# Altium schematic symbol library CUSTOM SCH - Copy.SchLib: 494 symbols (part 2 of 6) (continued)
## DMX_CON (continued)
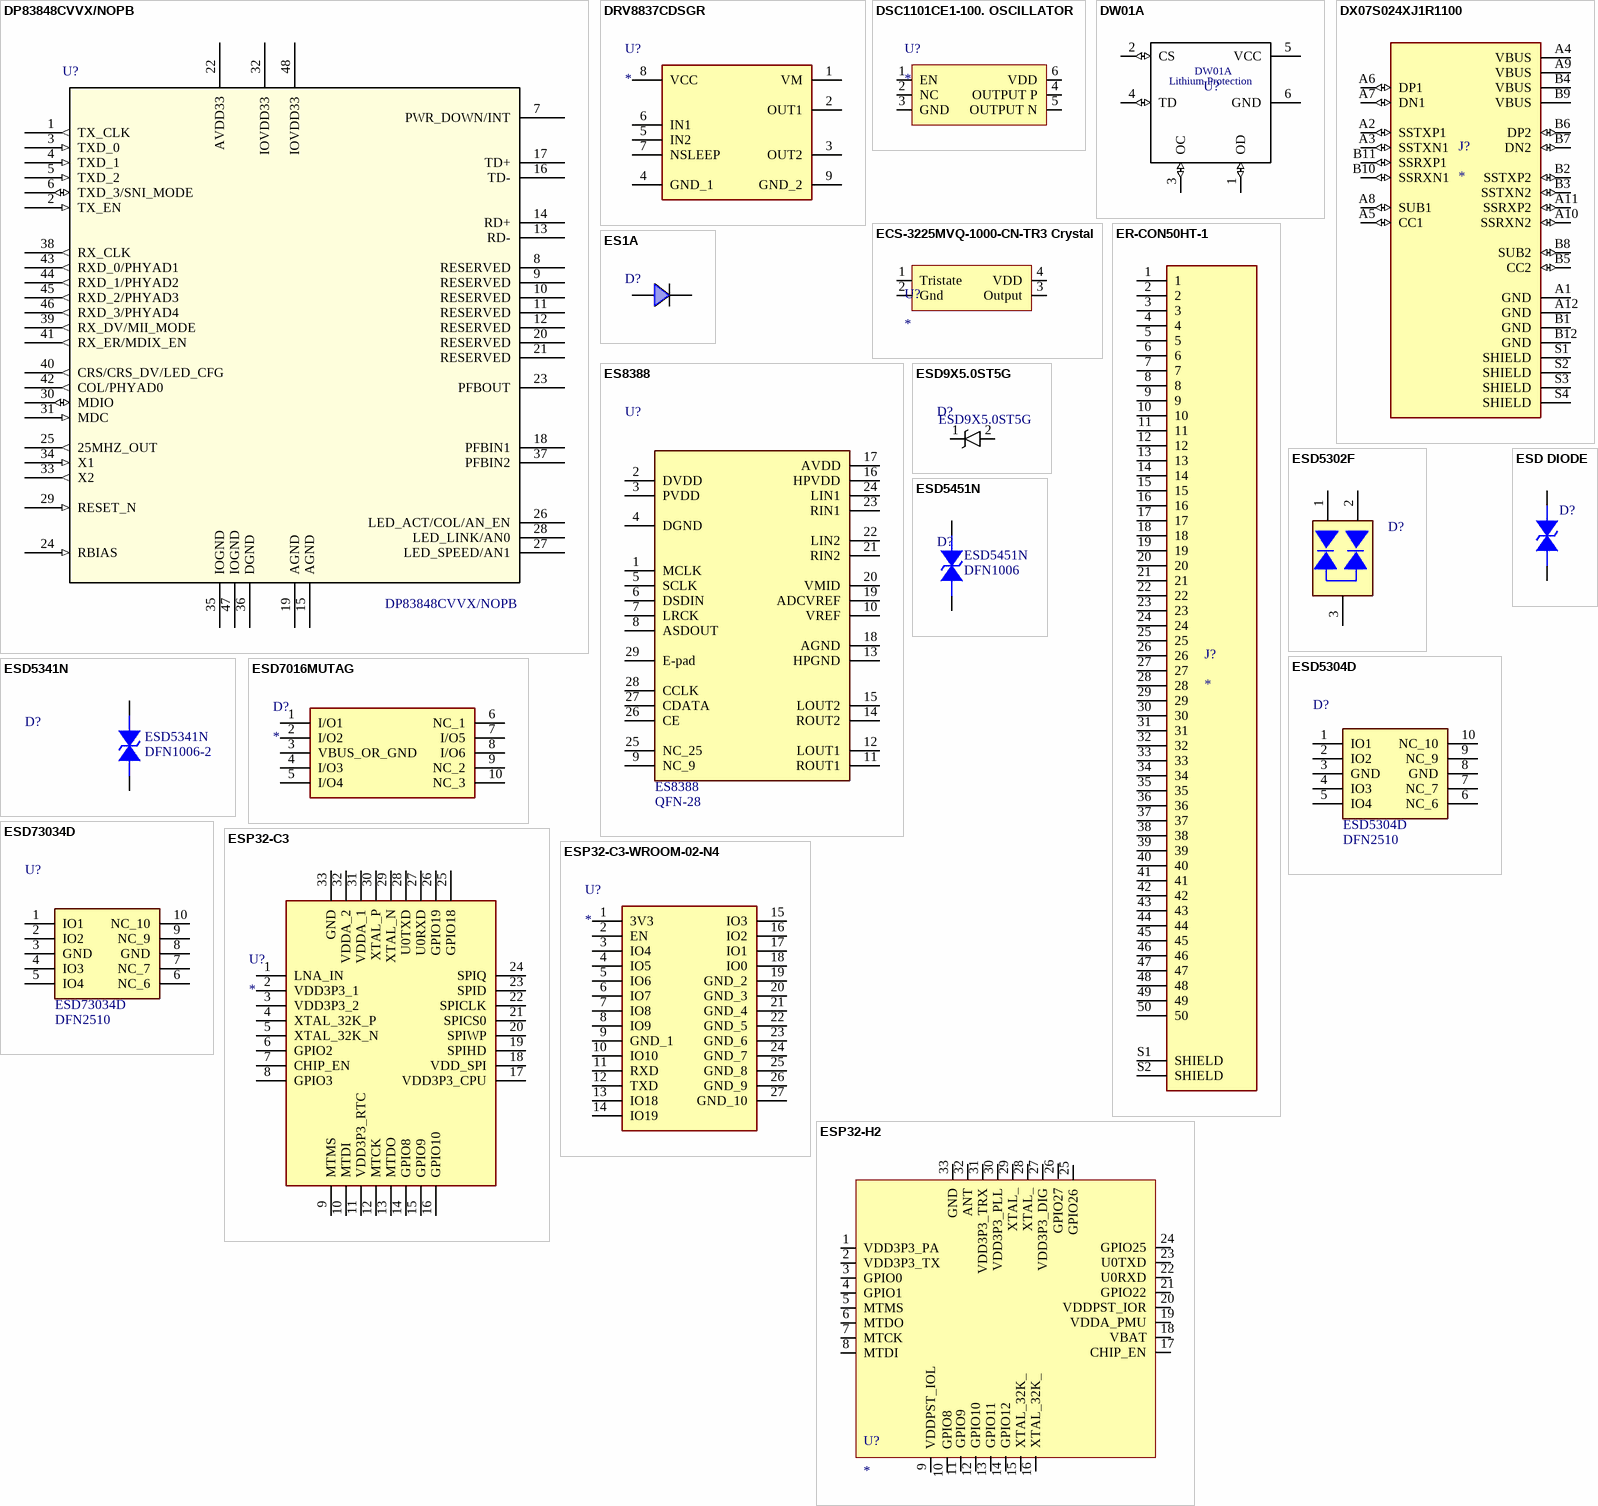
[diagram p9: symbols DP83848CVVX/NOPB to ESP32-H2]
text: O

## DP83848CVVX/NOPB
designator U?
IC TXRX ETHERNET 48LQFP; Manufacturer: TI National Semiconductor; Number of Channels: 1; Max Supply Voltage: 3.6V; Min Supply Voltage: 3V; Operating Supply Voltage: 3.3V; Nominal Supply Current: 92mA; Data Rate: 100Mbps; Max Power Dissipation: 267mW; Interface: Serial; Cable Length: 137m; Supplier 1: Digi-Key; Stock 1: 28934; Pricing 1: 1=5.16, 10=4.638, 100=3.8001, 500=3.2349 (USD); Mount: Surface Mount; Case/Package: 48-LQFP; Number of Pins: 48; Weight: 0.006409oz; Min Operating Temperature: 0°C; Max Operating Temperature: 70°C; Packaging: Tape and Reel; Package Quantity: 1000; Number of Transceivers: 1; Max Supply Current: 92mA; Length: 7mm; Height: 1.4mm; Width: 7mm; Radiation Hardening: No; REACH SVHC: No SVHC; Lead Free: Lead Free; ComponentLink1URL: http://www.ti.com/lit/ds/symlink/dp83848c.pdf?src-supplier=Digi-Key; ComponentLink1Description: http://www.ti.com/lit/ds/symlink/dp83848c.pdf?src-supplier=Digi-Key; ComponentLink2URL: http://www.ti.com/general/docs/lit/getliterature.tsp?genericPartNumber=DP83848YB&&fileType=pdf&src-supplier=Avnet; ComponentLink2Description: http://www.ti.com/general/docs/lit/getliterature.tsp?genericPartNumber=DP83848YB&&fileType=pdf&src-supplier=Avnet; ComponentLink3URL: http://www.ti.com/lit/gpn/dp83848c?src-supplier=Mouser; ComponentLink3Description: http://www.ti.com/lit/gpn/dp83848c?src-supplier=Mouser; ComponentLink4URL: http://www.farnell.com/datasheets/1668041.pdf?src-supplier=Element14; ComponentLink4Description: http://www.farnell.com/datasheets/1668041.pdf?src-supplier=Element14; Supplier Part Number 1: DP83848CVVX/NOPBCT-ND; Manufacturer Part Number: DP83848CVVX/NOPB
footprint 48LQFP
pins: 1 TX_CLK (out), 2 TX_EN (in), 3 TXD_0 (in), 4 TXD_1 (in), 5 TXD_2 (in), 6 TXD_3/SNI_MODE (io), 7 PWR_DOWN/INT, 8 RESERVED, 9 RESERVED, 10 RESERVED, 11 RESERVED, 12 RESERVED, 13 RD-, 14 RD+, 15 AGND (power), 16 TD-, 17 TD+, 18 PFBIN1, 19 AGND (power), 20 RESERVED, 21 RESERVED, 22 AVDD33 (power), 23 PFBOUT, 24 RBIAS (in), 25 25MHZ_OUT (out), 26 LED_ACT/COL/AN_EN, 27 LED_SPEED/AN1, 28 LED_LINK/AN0, 29 RESET_N (in), 30 MDIO (io), 31 MDC (in), 32 IOVDD33 (power), 33 X2 (out), 34 X1 (in), 35 IOGND (power), 36 DGND (power), 37 PFBIN2, 38 RX_CLK (out), 39 RX_DV/MII_MODE (out), 40 CRS/CRS_DV/LED_CFG (out), 41 RX_ER/MDIX_EN (out), 42 COL/PHYAD0 (out), 43 RXD_0/PHYAD1 (out), 44 RXD_1/PHYAD2 (out), 45 RXD_2/PHYAD3 (out), 46 RXD_3/PHYAD4 (out), 47 IOGND (power), 48 IOVDD33 (power)

## DRV8837CDSGR
designator U?
1A Low-Voltage H-Bridge Driver; Manufacturer_Part_Number: DRV8837CDSGR; Case/Package: WSON-8
footprint SON50P200X200X80-9N
pins: 1 VM, 2 OUT1, 3 OUT2, 4 GND_1, 5 IN2, 6 IN1, 7 NSLEEP, 8 VCC, 9 GND_2

## DSC1101CE1-100. OSCILLATOR
designator U?
2.25V~3.6V -20℃~+70℃ 35mA 24MHz SMD3225-6P Oscillators ROHS; Manufacturer Part Number: DSC1101CE1-100.0000; Case/Package: *
pins: 1 EN, 2 NC, 3 GND, 4 OUTPUT P, 5 OUTPUT N, 6 VDD

## DW01A
designator U?  (value not drawn)
DW01A battery protection IC SOT-23-6; Case/Package: SOT-23-6; Manufacturer Part Number: DW01A
footprint SOT-23-6
pins: 1 OD (io), 2 CS (io), 3 OC (io), 4 TD (io), 5 VCC (power), 6 GND (power)
text: Lithium Protection

## DX07S024XJ1R1100
designator J?
USB-C _USB TYPE-C_ USB 3.1 _USB 3.1 Gen 2, Superspeed+_ Receptacle Connector 24 Position Surface Mount, Right Angle; Through Hole; Manufacturer Part Number: DX07S024XJ1R1100; Case/Package: None
footprint JAE_DX07S024XJ1R1100
footprint USB Type C 24 Pin
pins: A1 GND (power), A2 SSTXP1 (io), A3 SSTXN1 (io), A4 VBUS (power), A5 CC1 (io), A6 DP1 (io), A7 DN1 (io), A8 SUB1 (io), A9 VBUS (power), A10 SSRXN2 (io), A11 SSRXP2 (io), A12 GND (power), B1 GND (power), B2 SSTXP2 (io), B3 SSTXN2 (io), B4 VBUS (power), B5 CC2 (io), B6 DP2 (io), B7 DN2 (io), B8 SUB2 (io), B9 VBUS (power), B10 SSRXN1 (io), B11 SSRXP1 (io), B12 GND (power), S1 SHIELD, S2 SHIELD, S3 SHIELD, S4 SHIELD

## ECS-3225MVQ-1000-CN-TR3 Crystal
designator U?
footprint ECS-3225MVQ-1000-CN-TR3
pins: 1 Tristate, 2 Gnd, 3 Output, 4 VDD

## ER-CON50HT-1
designator J?
50 pins 0.5 Pitch SMD Horizontal Type Top Contact; Manufacturer Part Number: ER-CON50HT-1; Value: *; Package: Package Analog Devices
footprint EASTRISING_ER-CON50HT-1
footprint EASTRISING ER-CON50HT-1
pins: 1, 2, 3, 4, 5, 6, 7, 8, 9, 10, 11, 12, 13, 14, 15, 16, 17, 18, 19, 20, 21, 22, 23, 24, 25, 26, 27, 28, 29, 30, 31, 32, 33, 34, 35, 36, 37, 38, 39, 40, 41, 42, 43, 44, 45, 46, 47, 48, 49, 50, S1 SHIELD, S2 SHIELD

## ES1A
designator D?
DIODE GEN PURP 50V 1A SMA; Manufacturer: ON Semiconductor / Fairchild; Manufacturer Part Number: ES1A; Forward Voltage: 920mV; Peak Reverse Current: 5uA; Reverse Recovery Time: 15ns; Element Configuration: Single; Polarity: Standard; Capacitance: 7pF; Max Surge Current: 30A; Power Dissipation: 1.47W; Supplier 1: Digi-Key; Stock 1: 45000; Pricing 1: 7500=0.0787, 15000=0.0699, 37500=0.0656, 52500=0.0612 (USD); Mount: Surface Mount; Case/Package: SMA; Number of Pins: 2; Weight: 0.106g; Contact Plating: Tin,Matte; Min Operating Temperature: -50°C; Max Operating Temperature: 150°C; Packaging: Tape and Reel; Package Quantity: 7500; Max Repetitive Reverse Voltage (Vrrm): 50V; Forward Current: 1A; Voltage Rating (DC): 50V; Current Rating: 1A; Output Current: 1A; Recovery Time: 15ns; Average Rectified Current: 1A; Peak Non-Repetitive Surge Current: 30A; Max Forward Surge Current (Ifsm): 30A; Termination: SMD/SMT; Reverse Voltage: 50V; Max Reverse Voltage (DC): 50V; Length: 4.6mm; Height: 2.235mm; Width: 2.896mm; Radiation Hardening: No; REACH SVHC: No SVHC; Lead Free: Lead Free; ComponentLink1URL: http://www.mouser.com/ds/2/149/ES1A-183553.pdf?src-supplier=Mouser; ComponentLink1Description: http://www.mouser.com/ds/2/149/ES1A-183553.pdf?src-supplier=Mouser; ComponentLink2URL: http://www.farnell.com/datasheets/575529.pdf?src-supplier=Element14; ComponentLink2Description: http://www.farnell.com/datasheets/575529.pdf?src-supplier=Element14; ComponentLink3URL: http://www.fairchildsemi.com/ds/ES/ES1D.pdf?src-supplier=Avnet+Europe; ComponentLink3Description: http://www.fairchildsemi.com/ds/ES/ES1D.pdf?src-supplier=Avnet+Europe; ComponentLink4URL: http://www.fairchildsemi.com/datasheets/ES/ES1A.pdf?src-supplier=Digi-Key; ComponentLink4Description: http://www.fairchildsemi.com/datasheets/ES/ES1A.pdf?src-supplier=Digi-Key; ComponentLink5URL: https://www.fairchildsemi.com/package-drawings/DO/DO214AC.pdf?src-supplier=Digi-Key; ComponentLink5Description: https://www.fairchildsemi.com/package-drawings/DO/DO214AC.pdf?src-supplier=Digi-Key; Supplier Part Number 1: ES1AFSTR-ND
footprint es1a
pins: 1, 2

## ES8388
designator U?  Manufacturer Part Number: ES8388  Case/Package: QFN-28
ES8388 Audio Codec
footprint QFN28_4X4
pins: 1 MCLK, 2 DVDD, 3 PVDD, 4 DGND, 5 SCLK, 6 DSDIN, 7 LRCK, 8 ASDOUT, 9 NC_9, 10 VREF, 11 ROUT1, 12 LOUT1, 13 HPGND (power), 14 ROUT2, 15 LOUT2, 16 HPVDD, 17 AVDD, 18 AGND (power), 19 ADCVREF, 20 VMID, 21 RIN2, 22 LIN2, 23 RIN1, 24 LIN1, 25 NC_25, 26 CE, 27 CDATA, 28 CCLK, 29 E-pad

## ESD9X5.0ST5G
designator D?  Manufacturer Part Number: ESD9X5.0ST5G
12.3V Clamp 8.7A (8/20µs) Ipp Tvs Diode Surface Mount SOD-923; Manufacturer: ON Semiconductor; Direction: Unidirectional; Number of Elements: 1; Capacitance: 65pF; Operating Supply Voltage: 5V; Reverse Breakdown Voltage: 6.2V; Peak Pulse Power: 107W; Power Line Protection: No; ESD Protection: Yes; Test Current: 1mA; Max Reverse Leakage Current: 1uA; Max Power Dissipation: 150mW; Element Configuration: Single; Supplier 1: Digi-Key; RoHS: Yes; Category: ESD and Circuit Protection ICs; Stock 1: 835133; Pricing 1: 1=0.14000, 10=0.12700, 25=0.12120, 100=0.05340, 250=0.05120, 500=0.04190, 1000=0.02910, 2500=0.02542 (USD); Case/Package: SOD-923-2; Number of Pins: 2; Contact Plating: Tin,Matte; Min Operating Temperature: -55°C; Max Operating Temperature: 150°C; Packaging: Tape and Reel; Package Quantity: 1; Max Surge Current: 8.7A; Number of Unidirectional Channels: 1; Reverse Standoff Voltage: 5V; Min Breakdown Voltage: 6.2V; Clamping Voltage: 12.3V; Breakdown Voltage: 6.2V; Number of Channels: 1; Polarity: Unidirectional; Termination: SMD/SMT; Working Voltage: 5V; Leakage Current: 1uA; Max Breakdown Voltage: 6.2V; Peak Pulse Current: 8.7A; Number of Lines: 1; Composition: Zener; Length: 0.8mm; Height: 0.4mm; Width: 0.65mm; Depth: 0.6mm; Radiation Hardening: No; Lead Free: Lead Free; REACH SVHC: No SVHC; Halogen Free: Halogen Free; ComponentLink1URL: https://datasheet.ciiva.com/30478/0900766b812769b5-30478676.pdf?src-supplier=RSComponents; ComponentLink1Description: https://datasheet.ciiva.com/30478/0900766b812769b5-30478676.pdf?src-supplier=RSComponents; ComponentLink2URL: https://datasheet.ciiva.com/25958/esd9x3-3st5g-d-25958458.pdf?src-supplier=Avnet+Europe; ComponentLink2Description: https://datasheet.ciiva.com/25958/esd9x3-3st5g-d-25958458.pdf?src-supplier=Avnet+Europe; ComponentLink3URL: https://datasheet.ciiva.com/1219/1748783-1219324.pdf?src-supplier=Newark; ComponentLink3Description: https://datasheet.ciiva.com/1219/1748783-1219324.pdf?src-supplier=Newark; ComponentLink4URL: https://datasheet.ciiva.com/3304/esd9x3-3st5g-d-3304012.pdf?src-supplier=Avnet; ComponentLink4Description: https://datasheet.ciiva.com/3304/esd9x3-3st5g-d-3304012.pdf?src-supplier=Avnet; ComponentLink5URL: https://datasheet.ciiva.com/339/esd9x3-3st5g-d-339709.pdf?src-supplier=Digi-Key; ComponentLink5Description: https://datasheet.ciiva.com/339/esd9x3-3st5g-d-339709.pdf?src-supplier=Digi-Key; ComponentLink6URL: https://datasheet.ciiva.com/16215/esd9x3-3st5g-d-16215149.pdf?src-supplier=Future+Electronics; ComponentLink6Description: https://datasheet.ciiva.com/16215/esd9x3-3st5g-d-16215149.pdf?src-supplier=Future+Electronics; ComponentLink7URL: https://datasheet.ciiva.com/339/esd9x3-3st5g-d-339710.pdf?src-supplier=Digi-Key; ComponentLink7Description: https://datasheet.ciiva.com/339/esd9x3-3st5g-d-339710.pdf?src-supplier=Digi-Key; ComponentLink8URL: https://datasheet.ciiva.com/339/esd9x3-3st5g-d-339711.pdf?src-supplier=Digi-Key; ComponentLink8Description: https://datasheet.ciiva.com/339/esd9x3-3st5g-d-339711.pdf?src-supplier=Digi-Key; Supplier Part Number 1: ESD9X5.0ST5GOSCT-ND
footprint SOD-923
pins: 1 K, 2 A

## ESD5302F
designator D?
2-Lines, Uni-directional,Ultra-low Capacitance.Transient Voltage Suppressors; Manufacturer Part Number: ESD5302F; Case/Package: SOT-23-3
footprint SOT_23
footprint SOT23-3
pins: 1, 2, 3

## ESD5304D
designator D?  Manufacturer Part Number: ESD5304D  Case/Package: DFN2510
4-Lines, Uni-directional, Ultra-low Capacitance Transient Voltage Suppressors
footprint SON10_2R50X1R00X0R50
footprint DFN2510-10
pins: 1 IO1, 2 IO2, 3 GND (power), 4 IO3, 5 IO4, 6 NC_6, 7 NC_7, 8 GND (power), 9 NC_9, 10 NC_10

## ESD5341N
designator D?  Case/Package: DFN1006-2  Manufacturer Part Number: ESD5341N
1-Line, Bi-directional, Transient Voltage Suppressors.1pF.
footprint ESD0402
footprint DFN1006-2L
pins: 1, 2

## ESD5451N
designator D?  Manufacturer Part Number: ESD5451N  Case/Package: DFN1006
1-Line, Bi-directional, Transient Voltage Suppressors.17.5pF.
footprint ESD0402
footprint DFN1006-2L
pins: 1, 2

## ESD7016MUTAG
designator D?
ON Semiconductor ESD7016MUTAG Uni-Directional TVS Diode Array; Manufacturer Part Number: ESD7016MUTAG; Case/Package: 10-UFDFN
footprint ESD8006MUTAG
pins: 1 I/O1, 2 I/O2, 3 VBUS_OR_GND, 4 I/O3, 5 I/O4, 6 NC_1, 7 I/O5, 8 I/O6, 9 NC_2, 10 NC_3

## ESD73034D
designator U?  Manufacturer Part Number: ESD73034D  Case/Package: DFN2510
4-Lines, Uni-directional, Ultra-low Capacitance Transient Voltage Suppressors
footprint SON10_2R50X1R00X0R50
footprint DFN2510-10
pins: 1 IO1, 2 IO2, 3 GND (power), 4 IO3, 5 IO4, 6 NC_6, 7 NC_7, 8 GND (power), 9 NC_9, 10 NC_10

## ESD DIODE
designator D?
Bidirectional
pins: 1, 2

## ESP32-C3
designator U?
Ultra-Low-Power SoC with RISC-V Single-Core CPU; Manufacturer Part Number: ESP32-C3; Case/Package: QFN-32
footprint esp32_c3
pins: 1 LNA_IN, 2 VDD3P3_1, 3 VDD3P3_2, 4 XTAL_32K_P, 5 XTAL_32K_N, 6 GPIO2, 7 CHIP_EN, 8 GPIO3, 9 MTMS, 10 MTDI, 11 VDD3P3_RTC, 12 MTCK, 13 MTDO, 14 GPIO8, 15 GPIO9, 16 GPIO10, 17 VDD3P3_CPU, 18 VDD_SPI, 19 SPIHD, 20 SPIWP, 21 SPICS0, 22 SPICLK, 23 SPID, 24 SPIQ, 25 GPIO18, 26 GPIO19, 27 U0RXD, 28 U0TXD, 29 XTAL_N, 30 XTAL_P, 31 VDDA_1, 32 VDDA_2, 33 GND

## ESP32-C3-WROOM-02-N4
designator U?
WiFi Modules (802.11) SMD module; Manufacturer Part Number: ESP32-C3-WROOM-02-N4; Case/Package: SMD
footprint ESP32 C3 WROOM (ESP32-C3-WROOM-02-H4)
pins: 1 3V3, 2 EN, 3 IO4, 4 IO5, 5 IO6, 6 IO7, 7 IO8, 8 IO9, 9 GND_1, 10 IO10, 11 RXD, 12 TXD, 13 IO18, 14 IO19, 15 IO3, 16 IO2, 17 IO1, 18 IO0, 19 GND_2, 20 GND_3, 21 GND_4, 22 GND_5, 23 GND_6, 24 GND_7, 25 GND_8, 26 GND_9, 27 GND_10

## ESP32-H2
designator U?
footprint ESP32_h2
pins: 1 VDD3P3_PA, 2 VDD3P3_TX, 3 GPIO0, 4 GPIO1, 5 MTMS, 6 MTDO, 7 MTCK, 8 MTDI, 9 VDDPST_IOL, 10 GPIO8, 11 GPIO9, 12 GPIO10, 13 GPIO11, 14 GPIO12, 15 XTAL_32K_, 16 XTAL_32K_, 17 CHIP_EN, 18 VBAT, 19 VDDA_PMU, 20 VDDPST_IOR, 21 GPIO22, 22 U0RXD, 23 U0TXD, 24 GPIO25, 25 GPIO26, 26 GPIO27, 27 VDD3P3_DIG, 28 XTAL_, 29 XTAL_, 30 VDD3P3_PLL, 31 VDD3P3_TRX, 32 ANT, 33 GND

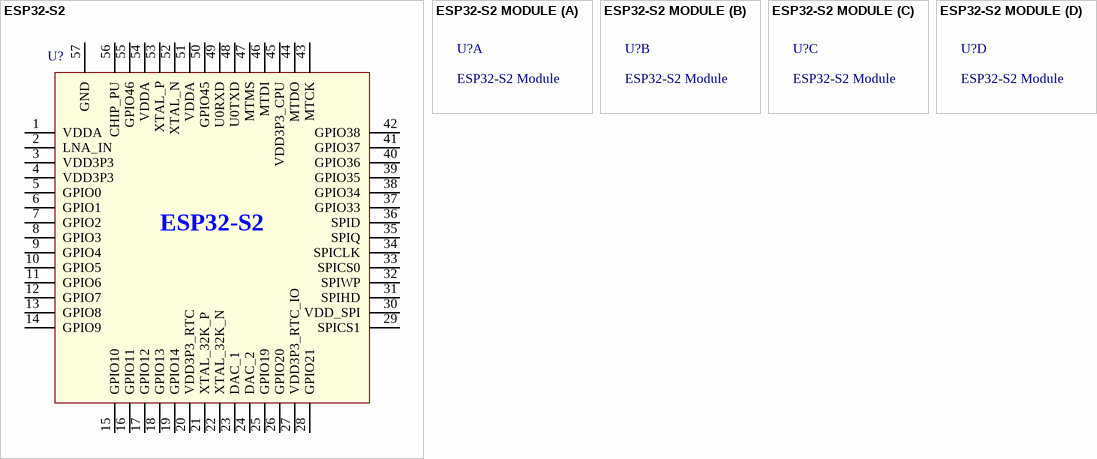
[diagram p10: symbols ESP32-S2 to ESP32-S2 MODULE]

## ESP32-S2
designator U?  (value not drawn)
WiFi 802.11b/g/n Transceiver Module 2.4GHz; Case/Package: 56-VFQFN; Manufacturer Part Number: ESP32-S2; Value: *
footprint QFN56-7x7mm
pins: 1 VDDA, 2 LNA_IN, 3 VDD3P3, 4 VDD3P3, 5 GPIO0, 6 GPIO1, 7 GPIO2, 8 GPIO3, 9 GPIO4, 10 GPIO5, 11 GPIO6, 12 GPIO7, 13 GPIO8, 14 GPIO9, 15 GPIO10, 16 GPIO11, 17 GPIO12, 18 GPIO13, 19 GPIO14, 20 VDD3P3_RTC, 21 XTAL_32K_P, 22 XTAL_32K_N, 23 DAC_1, 24 DAC_2, 25 GPIO19, 26 GPIO20, 27 VDD3P3_RTC_IO, 28 GPIO21, 29 SPICS1, 30 VDD_SPI, 31 SPIHD, 32 SPIWP, 33 SPICS0, 34 SPICLK, 35 SPIQ, 36 SPID, 37 GPIO33, 38 GPIO34, 39 GPIO35, 40 GPIO36, 41 GPIO37, 42 GPIO38, 43 MTCK, 44 MTDO, 45 VDD3P3_CPU, 46 MTDI, 47 MTMS, 48 U0TXD, 49 U0RXD, 50 GPIO45, 51 VDDA, 52 XTAL_N, 53 XTAL_P, 54 VDDA, 55 GPIO46, 56 CHIP_PU, 57 GND

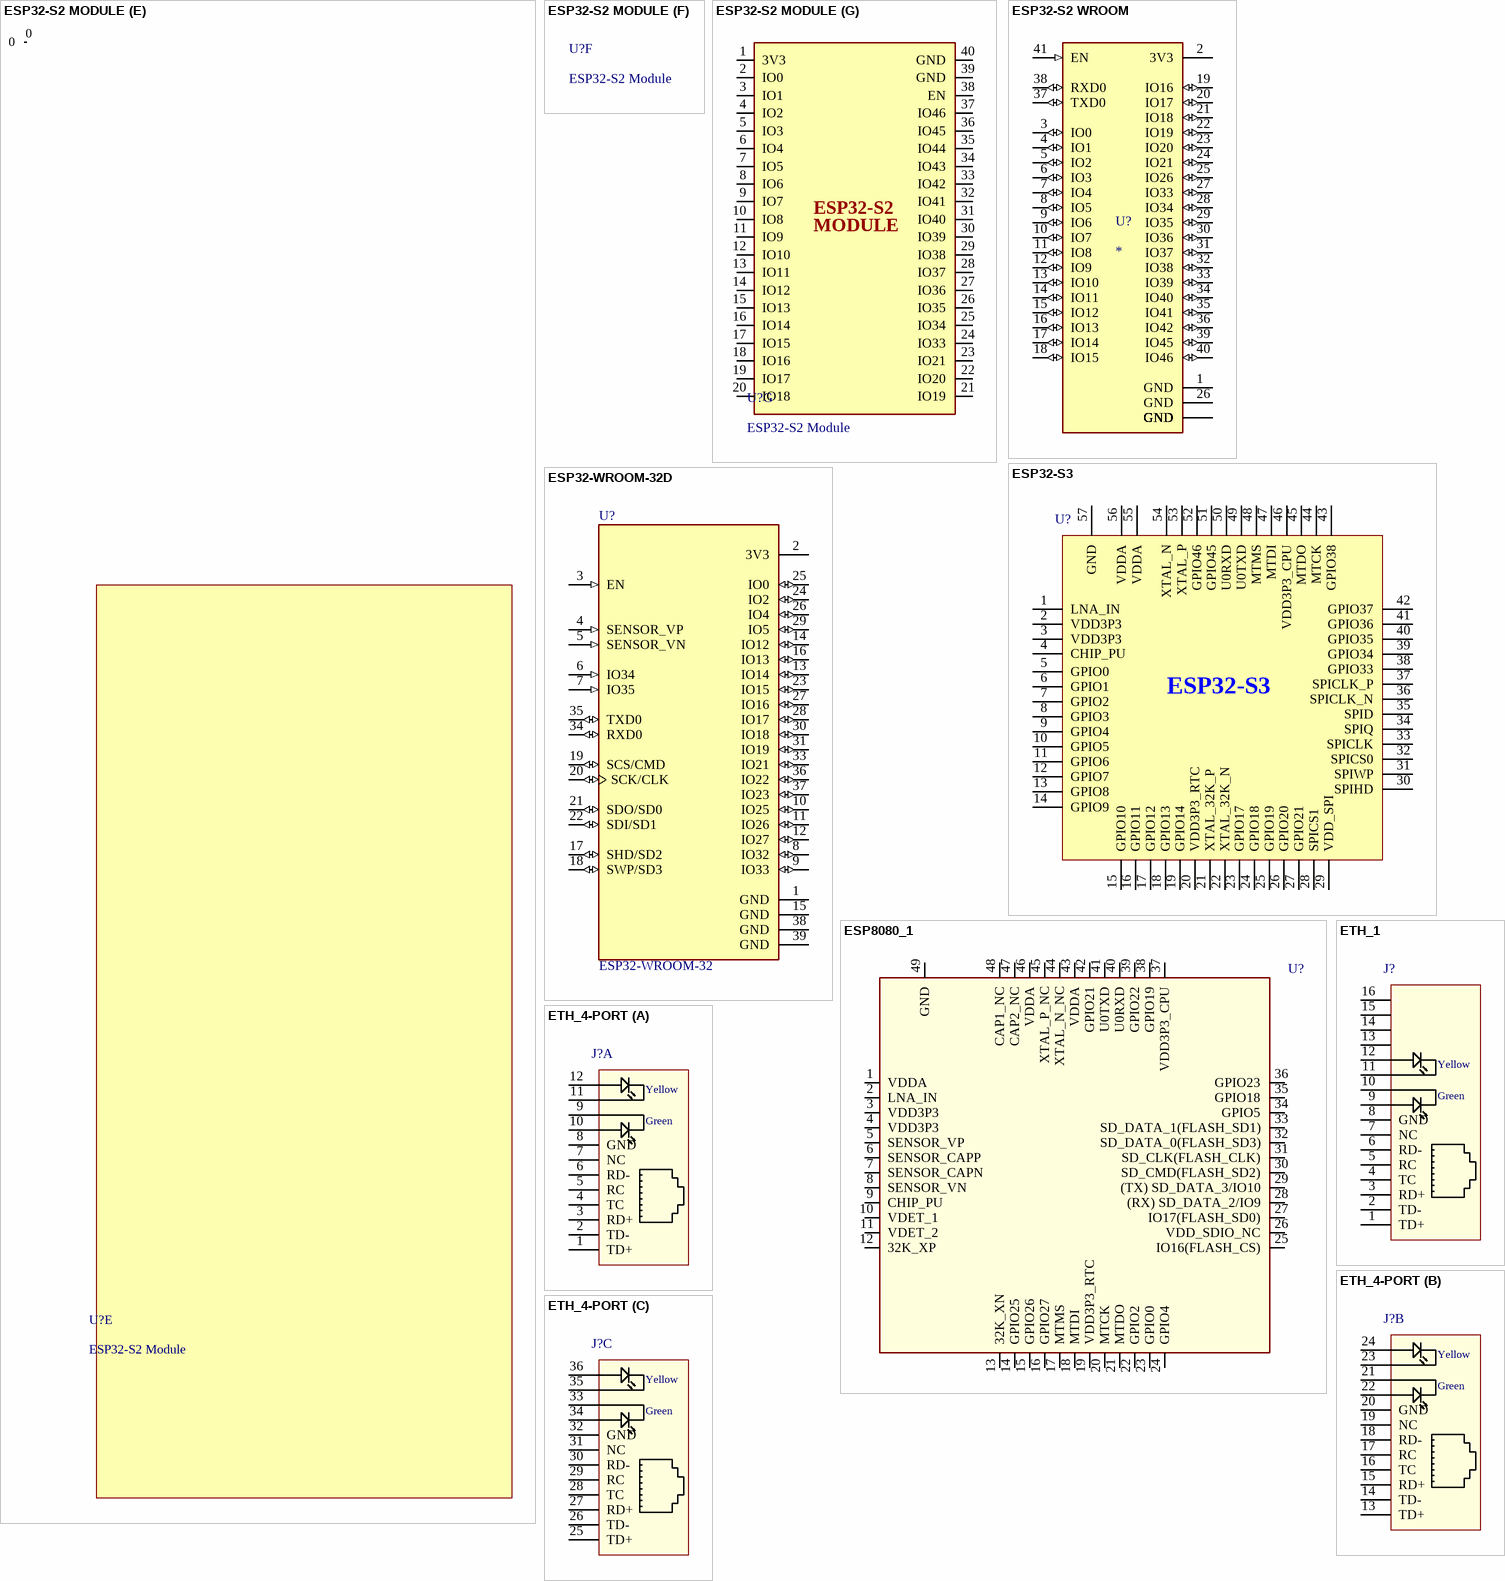
[diagram p11: symbols ESP32-S2 MODULE to ETH_4-PORT]

## ESP32-S2 MODULE
designator U?, comment ESP32-S2 Module
ESP32-S2 Module PCB mount 20*40 mm; Case/Package: SMD; Manufacturer Part Number: *
footprint ESP32-S2 Module (ESP32-S2 Module 20*40mm)
part E pins: 0
part G pins: 1 3V3, 2 IO0, 3 IO1, 4 IO2, 5 IO3, 6 IO4, 7 IO5, 8 IO6, 9 IO7, 10 IO8, 11 IO9, 12 IO10, 13 IO11, 14 IO12, 15 IO13, 16 IO14, 17 IO15, 18 IO16, 19 IO17, 20 IO18, 21 IO19, 22 IO20, 23 IO21, 24 IO33, 25 IO34, 26 IO35, 27 IO36, 28 IO37, 29 IO38, 30 IO39, 31 IO40, 32 IO41, 33 IO42, 34 IO43, 35 IO44, 36 IO45, 37 IO46, 38 EN, 39 GND, 40 GND
part G text: ESP32-S2; MODULE

## ESP32-S2 WROOM
designator U?
WiFi 802.11b/g/n Transceiver Module 2.4GHz PCB Trace Surface Mount; Manufacturer Part Number: ESP32-S2-WROOM; Case/Package: Castalled Module
footprint ESP32-S2 WROOM
pins: 1 GND (power), 2 3V3 (power), 3 IO0 (io), 4 IO1 (io), 5 IO2 (io), 6 IO3 (io), 7 IO4 (io), 8 IO5 (io), 9 IO6 (io), 10 IO7 (io), 11 IO8 (io), 12 IO9 (io), 13 IO10 (io), 14 IO11 (io), 15 IO12 (io), 16 IO13 (io), 17 IO14 (io), 18 IO15 (io), 19 IO16 (io), 20 IO17 (io), 21 IO18 (io), 22 IO19 (io), 23 IO20 (io), 24 IO21 (io), 25 IO26 (io), 26 GND (power), 27 IO33 (io), 28 IO34 (io), 29 IO35 (io), 30 IO36 (io), 31 IO37 (io), 32 IO38 (io), 33 IO39 (io), 34 IO40 (io), 35 IO41 (io), 36 IO42 (io), 37 TXD0 (io), 38 RXD0 (io), 39 IO45 (io), 40 IO46 (io), 41 EN (in), 42 GND (power), 43.1 GND (power), 43.2 GND (power), 43.3 GND (power), 43.4 GND (power), 43.5 GND (power), 43.6 GND (power), 43.7 GND (power), 43.8 GND (power), 43.9 GND (power), 43.10 GND (power), 43.11 GND (power), 43.12 GND (power), 43.13 GND (power), 43.14 GND (power), 43.15 GND (power), 43.16 GND (power), 43.17 GND (power), 43.18 GND (power), 43.19 GND (power), 43.20 GND (power), 43.21 GND (power)

## ESP32-S3
designator U?
ESP32-S3 SoC; Manufacturer Part Number: ESP32-S3; Case/Package: 56-VFQFN; Value: *
footprint ESP32-S3 (SoC)
pins: 1 LNA_IN, 2 VDD3P3, 3 VDD3P3, 4 CHIP_PU, 5 GPIO0, 6 GPIO1, 7 GPIO2, 8 GPIO3, 9 GPIO4, 10 GPIO5, 11 GPIO6, 12 GPIO7, 13 GPIO8, 14 GPIO9, 15 GPIO10, 16 GPIO11, 17 GPIO12, 18 GPIO13, 19 GPIO14, 20 VDD3P3_RTC, 21 XTAL_32K_P, 22 XTAL_32K_N, 23 GPIO17, 24 GPIO18, 25 GPIO19, 26 GPIO20, 27 GPIO21, 28 SPICS1, 29 VDD_SPI, 30 SPIHD, 31 SPIWP, 32 SPICS0, 33 SPICLK, 34 SPIQ, 35 SPID, 36 SPICLK_N, 37 SPICLK_P, 38 GPIO33, 39 GPIO34, 40 GPIO35, 41 GPIO36, 42 GPIO37, 43 GPIO38, 44 MTCK, 45 MTDO, 46 VDD3P3_CPU, 47 MTDI, 48 MTMS, 49 U0TXD, 50 U0RXD, 51 GPIO45, 52 GPIO46, 53 XTAL_P, 54 XTAL_N, 55 VDDA, 56 VDDA, 57 GND

## ESP32-WROOM-32D
designator U?  Manufacturer Part Number: ESP32-WROOM-32  (hidden comment: ESP32-WROOM-32D)
SMD MODULE, ESP32-D0WDQ6, 32MBIT; Manufacturer 1: Espressif Systems; Frequency: 2.5GHz; Data Rate: 150Mbps; Sensitivity: -98dBm; Operating Supply Voltage: 3.6V; Supplier 1: Digi-Key; RoHS: No; Category: RF Receivers, Transceivers; Pricing 1: 1=3.80000 (USD); Mount: Surface Mount; Case/Package: SMD/SMT; Weight: 0.088185oz; Min Operating Temperature: -40°C; Max Operating Temperature: 85°C; Packaging: Cut Tape; Package Quantity: 550; ComponentLink1URL: https://datasheet.ciiva.com/70828/esp32-wroom-32-datasheet-en-70828769.pdf?src-supplier=Digi-Key; ComponentLink1Description: https://datasheet.ciiva.com/70828/esp32-wroom-32-datasheet-en-70828769.pdf?src-supplier=Digi-Key; ComponentLink2URL: https://datasheet.ciiva.com/69725/esp32-datasheet-en-69725253.pdf?src-supplier=Digi-Key; ComponentLink2Description: https://datasheet.ciiva.com/69725/esp32-datasheet-en-69725253.pdf?src-supplier=Digi-Key; Supplier Part Number 1: 1904-1010-1-ND
footprint ESP32-WROOM-3D
pins: 1 GND (power), 2 3V3 (power), 3 EN (in), 4 SENSOR_VP (in), 5 SENSOR_VN (in), 6 IO34 (in), 7 IO35 (in), 8 IO32 (io), 9 IO33 (io), 10 IO25 (io), 11 IO26 (io), 12 IO27 (io), 13 IO14 (io), 14 IO12 (io), 15 GND (power), 16 IO13 (io), 17 SHD/SD2 (io), 18 SWP/SD3 (io), 19 SCS/CMD (io), 20 SCK/CLK (io), 21 SDO/SD0 (io), 22 SDI/SD1 (io), 23 IO15 (io), 24 IO2 (io), 25 IO0 (io), 26 IO4 (io), 27 IO16 (io), 28 IO17 (io), 29 IO5 (io), 30 IO18 (io), 31 IO19 (io), 33 IO21 (io), 34 RXD0 (io), 35 TXD0 (io), 36 IO22 (io), 37 IO23 (io), 38 GND (power), 39 GND (power)

## ESP8080_1
designator U?
ESP32 Wifi Bluetooth,4MByte Flash; Manufacturer 1: Espressif Systems; Manufacturer Part Number: ESP32-PICO-D4; Interface: I2C,SPI,GPIO,PWM,SDIO,UART; Frequency: 2.5GHz; Data Rate: 150Mbps; Sensitivity: -98.4dBm; Memory Size: 4MB; ComponentLink1URL: https://www.espressif.com/sites/default/files/documentation/esp32-pico-d4_datasheet_en.pdf?src-supplier=Digi-Key; ComponentLink1Description: https://www.espressif.com/sites/default/files/documentation/esp32-pico-d4_datasheet_en.pdf?src-supplier=Digi-Key; Supplier 1: Digi-Key; RoHS: No; Stock 1: 1598; Pricing 1: 1=4.50000 (USD); Mount: Surface Mount; Case/Package: QFN-48; Min Operating Temperature: -40°C; Max Operating Temperature: 85°C; Supplier Part Number 1: 1904-1029-1-ND
footprint ESP32_PICO_D4_2
pins: 1 VDDA, 2 LNA_IN, 3 VDD3P3, 4 VDD3P3, 5 SENSOR_VP, 6 SENSOR_CAPP, 7 SENSOR_CAPN, 8 SENSOR_VN, 9 CHIP_PU, 10 VDET_1, 11 VDET_2, 12 32K_XP, 13 32K_XN, 14 GPIO25, 15 GPIO26, 16 GPIO27, 17 MTMS, 18 MTDI, 19 VDD3P3_RTC, 20 MTCK, 21 MTDO, 22 GPIO2, 23 GPIO0, 24 GPIO4, 25 IO16(FLASH_CS), 26 VDD_SDIO_NC, 27 IO17(FLASH_SD0), 28 (RX) SD_DATA_2/IO9, 29 (TX) SD_DATA_3/IO10, 30 SD_CMD(FLASH_SD2), 31 SD_CLK(FLASH_CLK), 32 SD_DATA_0(FLASH_SD3), 33 SD_DATA_1(FLASH_SD1), 34 GPIO5, 35 GPIO18, 36 GPIO23, 37 VDD3P3_CPU, 38 GPIO19, 39 GPIO22, 40 U0RXD (power), 41 U0TXD (power), 42 GPIO21, 43 VDDA, 44 XTAL_N_NC, 45 XTAL_P_NC, 46 VDDA, 47 CAP2_NC, 48 CAP1_NC, 49 GND (power)

## ETH_1
designator J?
HR911105A - Hanrun - RJ45 Horizontal - Ethernet Transformer Sunrom Product Code for Ordering:4266; Case/Package: TH; Manufacturer Part Number: HR911105A
footprint ETH_2
pins: 1 TD+, 2 TD-, 3 RD+, 4 TC, 5 RC, 6 RD-, 7 NC, 8 GND, 9 G-ANODE, 10 G-CATHODE, 11 Y-CATHODE, 12 Y-ANODE, 13 SHELL4, 14 SHELL3, 15 SHELL2, 16 SHELL1
text: Yellow; Green

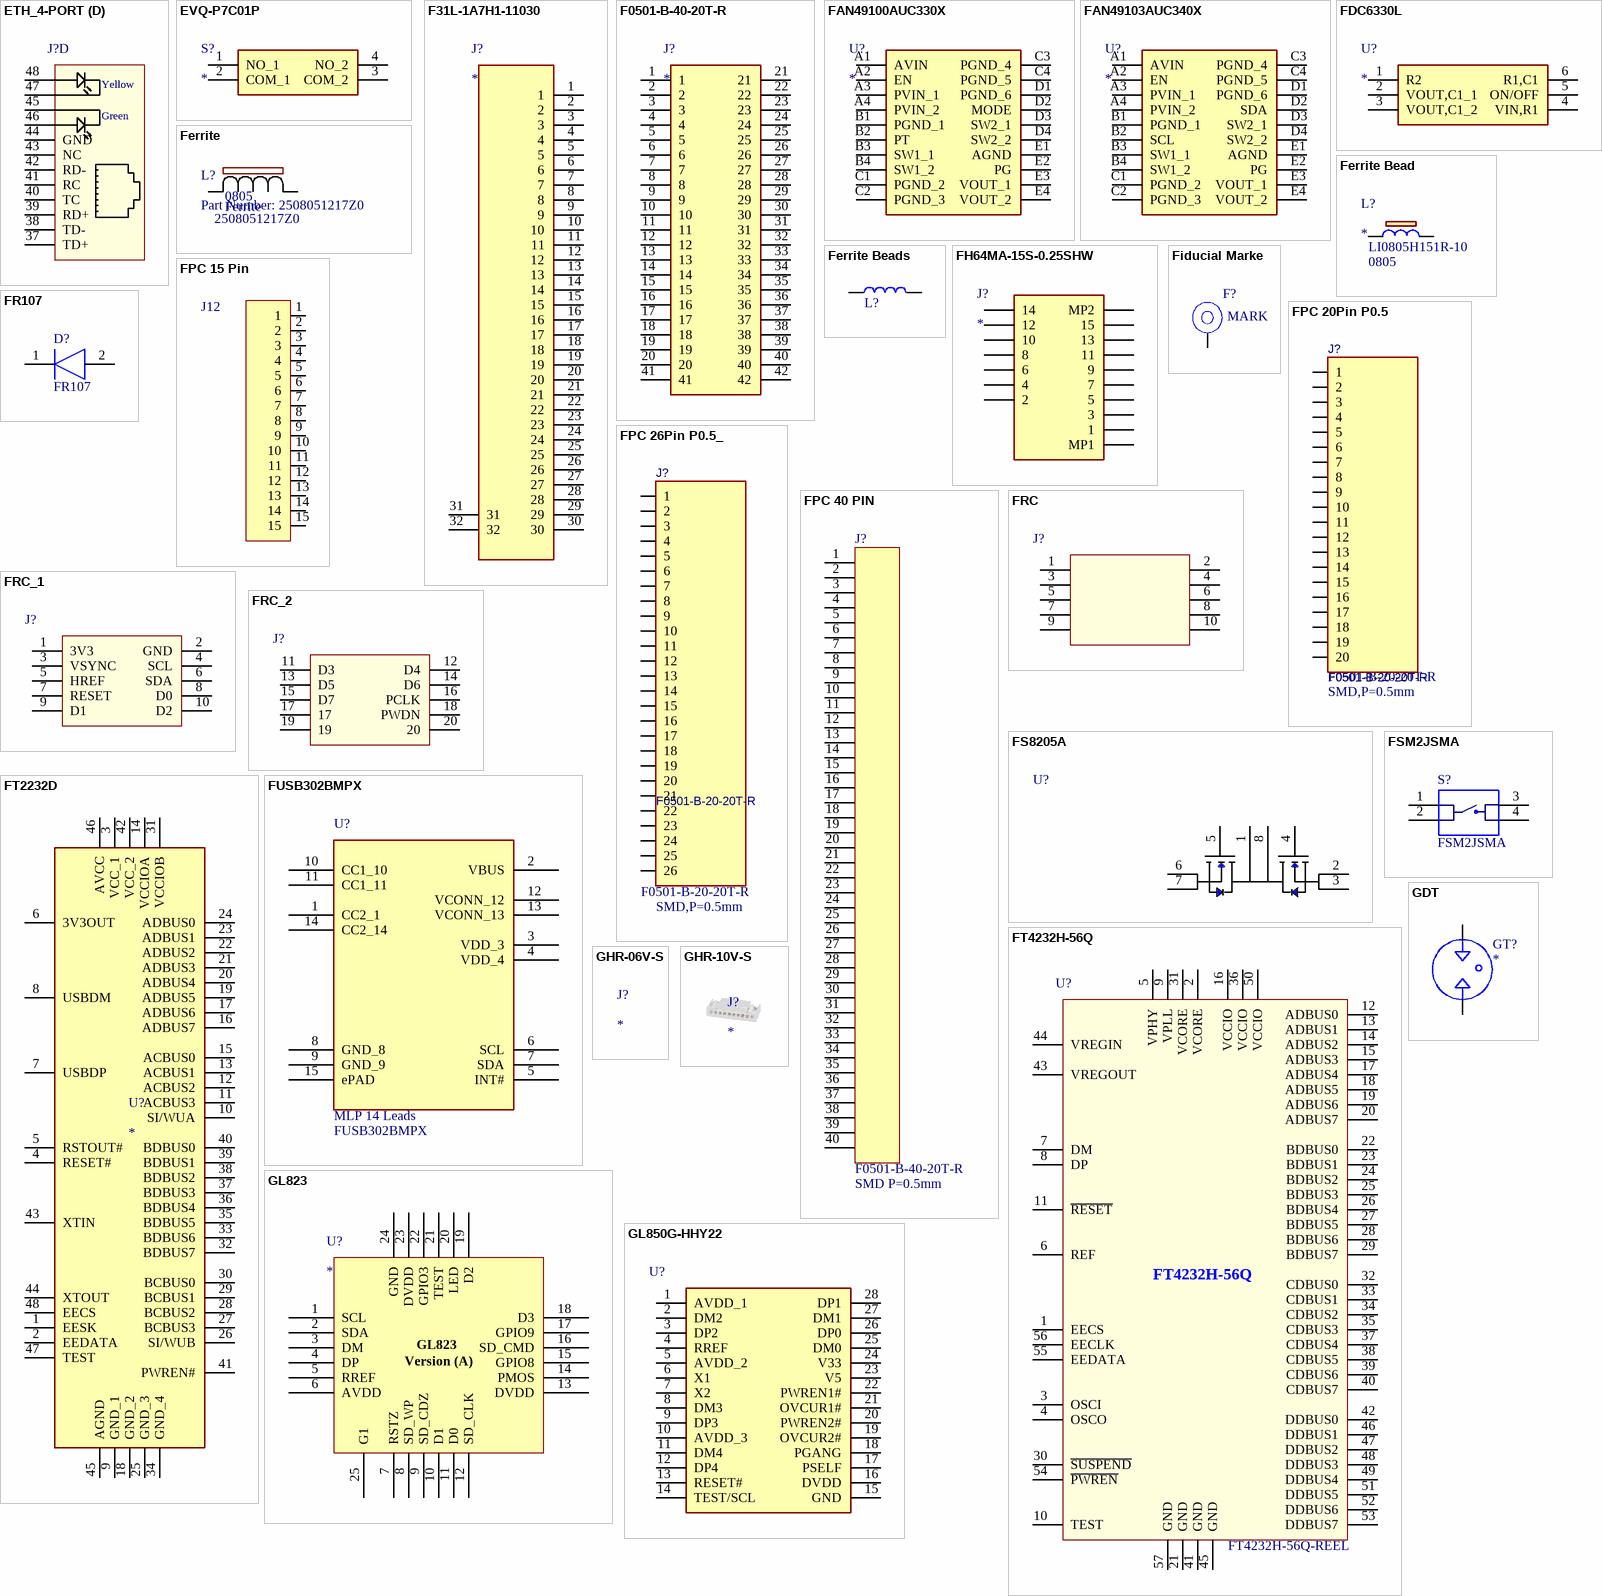
[diagram p12: symbols ETH_4-PORT to GL850G-HHY22]

## ETH_4-PORT
designator J?
RJ45 48 4 Through Hole Ethernet Connectors/Modular Connectors; Manufacturer Part Number: RJ45-B-1*4; Case/Package: TH
footprint RJ45-4_PORT
part A pins: 1 TD+, 2 TD-, 3 RD+, 4 TC, 5 RC, 6 RD-, 7 NC, 8 GND, 9 G-ANODE, 10 G-CATHODE, 11 Y-CATHODE, 12 Y-ANODE
part B pins: 13 TD+, 14 TD-, 15 RD+, 16 TC, 17 RC, 18 RD-, 19 NC, 20 GND, 21 G-ANODE, 22 G-CATHODE, 23 Y-CATHODE, 24 Y-ANODE
part C pins: 25 TD+, 26 TD-, 27 RD+, 28 TC, 29 RC, 30 RD-, 31 NC, 32 GND, 33 G-ANODE, 34 G-CATHODE, 35 Y-CATHODE, 36 Y-ANODE
part D pins: 37 TD+, 38 TD-, 39 RD+, 40 TC, 41 RC, 42 RD-, 43 NC, 44 GND, 45 G-ANODE, 46 G-CATHODE, 47 Y-CATHODE, 48 Y-ANODE
part A text: Yellow; Green
part B text: Yellow; Green
part C text: Yellow; Green
part D text: Yellow; Green

## EVQ-P7C01P
designator S?
Black Side Tactile Switch; Manufacturer_Part_Number: EVQ-P7C01P; Case/Package: SMD; Value: *
footprint EVQP7C01P
pins: 1 NO_1, 2 COM_1, 3 COM_2, 4 NO_2

## F31L-1A7H1-11030
designator J?
FPC Connector 0.5mm pitch; Manufacturer Part Number: F31L-1A7H1-11030; Case/Package: SMD
footprint F31L-1A7H1-11030
pins: 1, 2, 3, 4, 5, 6, 7, 8, 9, 10, 11, 12, 13, 14, 15, 16, 17, 18, 19, 20, 21, 22, 23, 24, 25, 26, 27, 28, 29, 30, 31, 32

## F0501-B-40-20T-R
designator J?
footprint CON_FPC_40PIN_P0.5_FPC-05FB-40PH20
pins: 1, 2, 3, 4, 5, 6, 7, 8, 9, 10, 11, 12, 13, 14, 15, 16, 17, 18, 19, 20, 21, 22, 23, 24, 25, 26, 27, 28, 29, 30, 31, 32, 33, 34, 35, 36, 37, 38, 39, 40, 41, 42

## FAN49100AUC330X
designator U?
IC REG BCK BOOST 3.3V 2A 20WLCSP; Manufacturer Name: ON Semiconductor; Manufacturer Part Number: FAN49100AUC330X; Case/Package: WLCSP-20
footprint BGA20C40P4X5_162X202X62
pins: A1 AVIN, A2 EN, A3 PVIN_1, A4 PVIN_2, B1 PGND_1, B2 PT, B3 SW1_1, B4 SW1_2, C1 PGND_2, C2 PGND_3, C3 PGND_4, C4 PGND_5, D1 PGND_6, D2 MODE, D3 SW2_1, D4 SW2_2, E1 AGND, E2 PG, E3 VOUT_1, E4 VOUT_2

## FAN49103AUC340X
designator U?
Switching Voltage Regulators 2.5 A TinyPower I2C Buck-Boost Regulator; Manufacturer_Name: ON Semiconductor; Manufacturer Part Number: FAN49103AUC340X; Datasheet Link: https://componentsearchengine.com/Datasheets/1/FAN49103AUC340X.pdf; Height: 0.625mm; Mouser Part Number: 512-FAN49103AUC340X; Mouser Price/Stock: https://www.mouser.co.uk/ProductDetail/ON-Semiconductor-Fairchild/FAN49103AUC340X?qs=E58pcOqB2RLW0671bQW5Lg%3D%3D; Arrow Part Number: FAN49103AUC340X; Arrow Price/Stock: https://www.arrow.com/en/products/fan49103auc340x/on-semiconductor
footprint BGA20C40P4X5_162X202X62
footprint BGA20C40P4X5_162X202X62
pins: A1 AVIN, A2 EN, A3 PVIN_1, A4 PVIN_2, B1 PGND_1, B2 SCL, B3 SW1_1, B4 SW1_2, C1 PGND_2, C2 PGND_3, C3 PGND_4, C4 PGND_5, D1 PGND_6, D2 SDA, D3 SW2_1, D4 SW2_2, E1 AGND, E2 PG, E3 VOUT_1, E4 VOUT_2

## FDC6330L
designator U?
Power Load Switch IC; Manufacturer Part Number: FDC6330L; Case/Package: SOT-6
footprint SOT95P280X110-6N
pins: 1 R2, 2 VOUT,C1_1, 3 VOUT,C1_2, 4 VIN,R1, 5 ON/OFF, 6 R1,C1

## Ferrite
designator L?, comment Part Number: 2508051217Z0  Manufacturer Part Number: 2508051217Z0  Material: Ferrite  Case/Package: 0805
1 Signal Line Ferrite Bead 0805 300mA 200mOhm; Manufacturer: Fair-Rite; Impedance: 120R; Tolerance: 25%; Shielding: Unshielded; Resistance: 200mR; Current Rating: 250mA; Test Frequency: 100MHz; Outside Diameter: 0.9mm; Supplier 1: Digi-Key; Stock 1: 90447; Pricing 1: 1=0.11, 10=0.091, 25=0.0816, 50=0.0598, 100=0.0517, 250=0.0408, 500=0.0344, 1000=0.029 (USD); Core Material: Ferrite; Case Code (Metric): 2012; Case Code (Imperial): 0805; Min Operating Temperature: -55°C; Max Operating Temperature: 125°C; Package Quantity: 4000; Packaging: Tape and Reel; Max DC Current: 250mA; DC Resistance (DCR): 200mR; Termination: SMD/SMT; DC Current: 250mA; Military Standard: Not; Length: 2mm; Height: 0.9mm; Width: 1.25mm; Depth: 1.25mm; Radiation Hardening: No; REACH SVHC: Unknown; ComponentLink1URL: http://www.farnell.com/datasheets/908867.pdf?src-supplier=Element14; ComponentLink1Description: http://www.farnell.com/datasheets/908867.pdf?src-supplier=Element14; ComponentLink2URL: http://uk.rs-online.com/webdocs/0300/0900766b80300cfe.pdf?src-supplier=RSComponents; ComponentLink2Description: http://uk.rs-online.com/webdocs/0300/0900766b80300cfe.pdf?src-supplier=RSComponents; ComponentLink3URL: http://components.arrow.com/part/dataview/49793984S8790053N4455?src-supplier=Arrow; ComponentLink3Description: http://components.arrow.com/part/dataview/49793984S8790053N4455?src-supplier=Arrow; ComponentLink4URL: https://www.verical.com/server-webapp/html/getDatasheet?partID=253519&src-supplier=Verical; ComponentLink4Description: https://www.verical.com/server-webapp/html/getDatasheet?partID=253519&src-supplier=Verical; Supplier Part Number 1: 1934-1473-1-ND
footprint IND_25_0805
pins: 1, 2

## Ferrite Bead
designator L?  Manufacturer Part Number: LI0805H151R-10  Case/Package: 0805
Ferrite Beads 150ohms 100MHz .8A Monolithic 0805 SMD; ComponentLink1URL: http://www.farnell.com/datasheets/1685938.pdf?src-supplier=Element14; ComponentLink1Description: http://www.farnell.com/datasheets/1685938.pdf?src-supplier=Element14; ComponentLink2URL: https://assets.lairdtech.com/home/brandworld/files/LI0805H151R-10.pdf?src-supplier=Digi-Key; ComponentLink2Description: https://assets.lairdtech.com/home/brandworld/files/LI0805H151R-10.pdf?src-supplier=Digi-Key; ComponentLink3URL: https://www.alliedelec.com/m/d/63159f83fbe70e1160794b0cc8ac128f.pdf?src-supplier=Allied+Electronics; ComponentLink3Description: https://www.alliedelec.com/m/d/63159f83fbe70e1160794b0cc8ac128f.pdf?src-supplier=Allied+Electronics
footprint C0805 (pol cap)
pins: 1, 2

## Ferrite Beads
designator L?, comment FB  (value not drawn)
1kΩ @ 100MHz 1A 1 300mΩ 0603 Ferrite Beads RoHS; Manufacturer Part Number: CMBH1608S102LSP; Package: 0603
footprint SRN2010TA (Buck Inductor)
pins: 1, 2

## FH64MA-15S-0.25SHW
designator J?
Hirose FH64MA 64 Series 0.25mm Pitch 15 Way Horizontal SMT Female FPC Connector; Manufacturer Part Number: FH64MA-15S-0.25SHW(99); Case/Package: SMD
footprint FH64MA15S025SHW99
pins: 1, 2, 3, 4, 5, 6, 7, 8, 9, 10, 11, 12, 13, 14, 15, MP1, MP2

## Fiducial Marke
designator F?  Case/Package: MARK  (no BOM)
MARK Symble
footprint MARK
footprint Fiducial Marke
pins: 1
